# Altium schematic symbol library LATTICEPLDS_Library.SchLib: 291 symbols (part 26 of 32) (continued)
## LFSC80-FC1704/FCN1704 (continued)
part H pins: AA16 VCC12 (io), AA17 VCC (io), AA18 VCC (io), AA19 VCC (io), AA21 VCC (io), AA22 VCC (io), AA24 VCC (io), AA25 VCC (io), AA26 VCC (io), AA27 VCC12 (io), AB16 VCC12 (io), AB17 VCC (io), AB18 VCC (io), AB19 VCC (io), AB21 VCC (io), AB22 VCC (io), AB24 VCC (io), AB25 VCC (io), AB26 VCC (io), AB27 VCC12 (io), AC15 VCCAUX (io), AC16 VCC (io), AC18 VCC (io), AC20 VCC (io), AC23 VCC (io), AC25 VCC (io), AC27 VCC (io), AC28 VCCAUX (io), AD15 VCCAUX (io), AD17 VCC (io), AD19 VCC (io), AD21 VCC (io), AD22 VCC (io), AD24 VCC (io), AD26 VCC (io), AD28 VCCAUX (io), AE15 VCCAUX (io), AE16 VCC (io), AE18 VCC (io), AE20 VCC (io), AE21 VCC (io), AE22 VCC (io), AE23 VCC (io), AE25 VCC (io), AE27 VCC (io), AE28 VCCAUX (io), AF15 VCCAUX (io), AF16 VCC12 (io), AF17 VCC (io), AF19 VCC (io), AF21 VCC (io), AF22 VCC (io), AF24 VCC (io), AF26 VCC (io), AF27 VCC12 (io), AF28 VCCAUX (io), AG15 VCCAUX (io), AG17 VCC12 (io), AG18 VCC (io), AG20 VCC (io), AG21 VCC12 (io), AG22 VCC12 (io), AG23 VCC (io), AG25 VCC (io), AG26 VCC12 (io), AG28 VCCAUX (io), AH14 VCCAUX (io), AH16 VCCAUX (io), AH17 VCCAUX (io), AH18 VCCAUX (io), AH19 VCCAUX (io), AH20 VCCAUX (io), AH23 VCCAUX (io), AH24 VCCAUX (io), AH25 VCCAUX (io), AH26 VCCAUX (io), AH27 VCCAUX (io), AH29 VCCAUX (io), AJ14 VCCAUX (io), AJ15 VCCAUX (io), AJ28 VCCAUX (io), AJ29 VCCAUX (io), AT3 PROBE_VCC (io), P14 VCCAUX (io), P15 VCCAUX (io), P28 VCCAUX (io), P29 VCCAUX (io), R14 VCCAUX (io), R16 VCCAUX (io), R17 VCCAUX (io), R18 VCCAUX (io), R19 VCCAUX (io), R20 VCCAUX (io), R23 VCCAUX (io), R24 VCCAUX (io), R25 VCCAUX (io), R26 VCCAUX (io), R27 VCCAUX (io), R29 VCCAUX (io), T15 VCCAUX (io), T17 VCC12 (io), T18 VCC (io), T20 VCC (io), T21 VCC12 (io), T22 VCC12 (io), T23 VCC (io), T25 VCC (io), T26 VCC12 (io), T28 VCCAUX (io), U15 VCCAUX (io), U16 VCC12 (io), U17 VCC (io), U19 VCC (io), U21 VCC (io), U22 VCC (io), U24 VCC (io), U26 VCC (io), U27 VCC12 (io), U28 VCCAUX (io), V15 VCCAUX (io), V16 VCC (io), V18 VCC (io), V20 VCC (io), V21 VCC (io), V22 VCC (io), V23 VCC (io), V25 VCC (io), V27 VCC (io), V28 VCCAUX (io), W15 VCCAUX (io), W17 VCC (io), W19 VCC (io), W21 VCC (io), W22 VCC (io), W24 VCC (io), W26 VCC (io), W28 VCCAUX (io), Y15 VCCAUX (io), Y16 VCC (io), Y18 VCC (io), Y20 VCC (io), Y23 VCC (io), Y25 VCC (io), Y27 VCC (io), Y28 VCCAUX (io)
part I pins: A2 GND (io), A41 GND (io), AA3 GND (io), AA20 GND (io), AA23 GND (io), AA39 GND (io), AB4 GND (io), AB20 GND (io), AB23 GND (io), AB40 GND (io), AC8 GND (io), AC17 GND (io), AC19 GND (io), AC21 GND (io), AC22 GND (io), AC24 GND (io), AC26 GND (io), AC35 GND (io), AD12 GND (io), AD16 GND (io), AD18 GND (io), AD20 GND (io), AD23 GND (io), AD25 GND (io), AD27 GND (io), AD31 GND (io), AE3 GND (io), AE17 GND (io), AE19 GND (io), AE24 GND (io), AE26 GND (io), AE39 GND (io), AF7 GND (io), AF18 GND (io), AF20 GND (io), AF23 GND (io), AF25 GND (io), AF36 GND (io), AG11 GND (io), AG16 GND (io), AG19 GND (io), AG24 GND (io), AG27 GND (io), AG32 GND (io), AH4 GND (io), AH15 GND (io), AH28 GND (io), AH40 GND (io), AJ8 GND (io), AJ35 GND (io), AK12 GND (io), AK31 GND (io), AL3 GND (io), AL13 GND (io), AL19 GND (io), AL24 GND (io), AL30 GND (io), AL39 GND (io), AM7 GND (io), AM16 GND (io), AM27 GND (io), AM36 GND (io), AP4 GND (io), AP40 GND (io), AR8 GND (io), AR14 GND (io), AR20 GND (io), AR23 GND (io), AR29 GND (io), AR35 GND (io), AT11 GND (io), AT17 GND (io), AT26 GND (io), AT32 GND (io), AU2 PROBE_GND (io), AU3 GND (io), AU39 GND (io), AW6 GND (io), AW12 GND (io), AW18 GND (io), AW22 GND (io), AW28 GND (io), AW34 GND (io), AY9 GND (io), AY15 GND (io), AY21 GND (io), AY25 GND (io), AY31 GND (io), AY37 GND (io), B1 GND (io), B42 GND (io), BA1 GND (io), BA42 GND (io), BB2 GND (io), BB41 GND (io), C3 GND (io), C4 GND (io), C7 GND (io), C8 GND (io), C10 GND (io), C12 GND (io), C13 GND (io), C16 GND (io), C18 GND (io), C19 GND (io), C22 GND (io), C24 GND (io), C27 GND (io), C28 GND (io), C30 GND (io), C33 GND (io), C35 GND (io), C36 GND (io), C39 GND (io), C40 GND (io), D15 GND (io), D21 GND (io), D25 GND (io), D31 GND (io), F4 GND (io), F40 GND (io), G7 GND (io), G11 GND (io), G17 GND (io), G26 GND (io), G32 GND (io), G36 GND (io), H8 GND (io), H14 GND (io), H20 GND (io), H23 GND (io), H29 GND (io), H35 GND (io), J3 GND (io), J39 GND (io), L7 GND (io), L16 GND (io), L27 GND (io), L36 GND (io), M4 GND (io), M19 GND (io), M24 GND (io), M40 GND (io), N12 GND (io), N31 GND (io), P8 GND (io), P35 GND (io), R3 GND (io), R15 GND (io), R28 GND (io), R39 GND (io), T11 GND (io), T16 GND (io), T19 GND (io), T24 GND (io), T27 GND (io), T32 GND (io), U7 GND (io), U18 GND (io), U20 GND (io), U23 GND (io), U25 GND (io), U36 GND (io), V4 GND (io), V17 GND (io), V19 GND (io), V24 GND (io), V26 GND (io), V40 GND (io), W12 GND (io), W16 GND (io), W18 GND (io), W20 GND (io), W23 GND (io), W25 GND (io), W27 GND (io), W31 GND (io), Y8 GND (io), Y17 GND (io), Y19 GND (io), Y21 GND (io), Y22 GND (io), Y24 GND (io), Y26 GND (io), Y35 GND (io)
part J pins: A3 PCS 3E0 CH 0 OUT P / A_HDOUTP0_R (io), A4 PCS 3E0 CH 1 OUT N / A_HDOUTN1_R (io), A5 PCS 3E0 CH 2 OUT P / A_HDOUTP2_R (io), A6 PCS 3E0 CH 3 OUT P / A_HDOUTP3_R (io), A7 PCS 3E1 CH 0 OUT N / B_HDOUTN0_R (io), A8 PCS 3E1 CH 1 OUT N / B_HDOUTN1_R (io), A9 PCS 3E1 CH 2 OUT N / B_HDOUTN2_R (io), A10 PCS 3E1 CH 3 OUT N / B_HDOUTN3_R (io), A11 PCS 3E2 CH 0 OUT N / C_HDOUTN0_R (io), A12 PCS 3E2 CH 1 OUT N / C_HDOUTN1_R (io), A13 PCS 3E2 CH 2 OUT N / C_HDOUTN2_R (io), A14 PCS 3E2 CH 3 OUT N / C_HDOUTN3_R (io), A15 PCS 3E3 CH 0 OUT N / D_HDOUTN0_R (io), A16 PCS 3E3 CH 1 OUT N / D_HDOUTN1_R (io), A17 PCS 3E3 CH 2 OUT N / D_HDOUTN2_R (io), A18 PCS 3E3 CH 3 OUT N / D_HDOUTN3_R (io), A25 PCS 363 CH 3 OUT N / D_HDOUTN3_L (io), A26 PCS 363 CH 2 OUT N / D_HDOUTN2_L (io), A27 PCS 363 CH 1 OUT N / D_HDOUTN1_L (io), A28 PCS 363 CH 0 OUT N / D_HDOUTN0_L (io), A29 PCS 362 CH 3 OUT N / C_HDOUTN3_L (io), A30 PCS 362 CH 2 OUT N / C_HDOUTN2_L (io), A31 PCS 362 CH 1 OUT N / C_HDOUTN1_L (io), A32 PCS 362 CH 0 OUT N / C_HDOUTN0_L (io), A33 PCS 361 CH 3 OUT N / B_HDOUTN3_L (io), A34 PCS 361 CH 2 OUT N / B_HDOUTN2_L (io), A35 PCS 361 CH 1 OUT N / B_HDOUTN1_L (io), A36 PCS 361 CH 0 OUT N / B_HDOUTN0_L (io), A37 PCS 360 CH 3 OUT P / A_HDOUTP3_L (io), A38 PCS 360 CH 2 OUT P / A_HDOUTP2_L (io), A39 PCS 360 CH 1 OUT N / A_HDOUTN1_L (io), A40 PCS 360 CH 0 OUT P / A_HDOUTP0_L (io), AT40 XRES (io), B2 VCC12 (io), B3 PCS 3E0 CH 0 OUT N / A_HDOUTN0_R (io), B4 PCS 3E0 CH 1 OUT P / A_HDOUTP1_R (io), B5 PCS 3E0 CH 2 OUT N / A_HDOUTN2_R (io), B6 PCS 3E0 CH 3 OUT N / A_HDOUTN3_R (io), B7 PCS 3E1 CH 0 OUT P / B_HDOUTP0_R (io), B8 PCS 3E1 CH 1 OUT P / B_HDOUTP1_R (io), B9 PCS 3E1 CH 2 OUT P / B_HDOUTP2_R (io), B10 PCS 3E1 CH 3 OUT P / B_HDOUTP3_R (io), B11 PCS 3E2 CH 0 OUT P / C_HDOUTP0_R (io), B12 PCS 3E2 CH 1 OUT P / C_HDOUTP1_R (io), B13 PCS 3E2 CH 2 OUT P / C_HDOUTP2_R (io), B14 PCS 3E2 CH 3 OUT P / C_HDOUTP3_R (io), B15 PCS 3E3 CH 0 OUT P / D_HDOUTP0_R (io), B16 PCS 3E3 CH 1 OUT P / D_HDOUTP1_R (io), B17 PCS 3E3 CH 2 OUT P / D_HDOUTP2_R (io), B18 PCS 3E3 CH 3 OUT P / D_HDOUTP3_R (io), B25 PCS 363 CH 3 OUT P / D_HDOUTP3_L (io), B26 PCS 363 CH 2 OUT P / D_HDOUTP2_L (io), B27 PCS 363 CH 1 OUT P / D_HDOUTP1_L (io), B28 PCS 363 CH 0 OUT P / D_HDOUTP0_L (io), B29 PCS 362 CH 3 OUT P / C_HDOUTP3_L (io), B30 PCS 362 CH 2 OUT P / C_HDOUTP2_L (io), B31 PCS 362 CH 1 OUT P / C_HDOUTP1_L (io), B32 PCS 362 CH 0 OUT P / C_HDOUTP0_L (io), B33 PCS 361 CH 3 OUT P / B_HDOUTP3_L (io), B34 PCS 361 CH 2 OUT P / B_HDOUTP2_L (io), B35 PCS 361 CH 1 OUT P / B_HDOUTP1_L (io), B36 PCS 361 CH 0 OUT P / B_HDOUTP0_L (io), B37 PCS 360 CH 3 OUT N / A_HDOUTN3_L (io), B38 PCS 360 CH 2 OUT N / A_HDOUTN2_L (io), B39 PCS 360 CH 1 OUT P / A_HDOUTP1_L (io), B40 PCS 360 CH 0 OUT N / A_HDOUTN0_L (io), B41 VCC12 (io), C1 PCS 3E0 CH 0 IN P / A_HDINP0_R (io), C2 A_VDDOB1_R (io), C5 B_VDDOB3_R (io), C6 C_VDDIB1_R (io), C9 D_VDDOB2_R (io), C11 VCC12 (io), C14 VCC12 (io), C15 D_VDDIB2_R (io), C17 VCC12 (io), C29 D_VDDIB3_L (io), C31 VCC12 (io), C32 VCC12 (io), C34 D_VDDOB2_L (io), C37 C_VDDIB1_L (io), C38 B_VDDOB3_L (io), C41 A_VDDOB1_L (io), C42 PCS 360 CH 0 IN P / A_HDINP0_L (io), D1 PCS 3E0 CH 0 IN N / A_HDINN0_R (io), D2 A_VDDOB2_R (io), D3 PCS 3E0 CH 1 IN P / A_HDINP1_R (io), D4 PCS 3E0 CH 2 IN P / A_HDINP2_R (io), D5 PCS 3E0 CH 3 IN P / A_HDINP3_R (io), D6 PCS 3E1 CH 0 IN P / B_HDINP0_R (io), D7 PCS 3E1 CH 1 IN P / B_HDINP1_R (io), D8 PCS 3E1 CH 2 IN P / B_HDINP2_R (io), D9 PCS 3E1 CH 3 IN P / B_HDINP3_R (io), D10 PCS 3E2 CH 0 IN P / C_HDINP0_R (io), D11 PCS 3E2 CH 1 IN P / C_HDINP1_R (io), D12 PCS 3E2 CH 2 IN P / C_HDINP2_R (io), D13 PCS 3E2 CH 3 IN P / C_HDINP3_R (io), D14 PCS 3E3 CH 0 IN P / D_HDINP0_R (io), D16 PCS 3E3 CH 2 IN P / D_HDINP2_R (io), D17 D_VDDOB3_R (io), D24 VCC12 (io), D26 PCS 363 CH 3 IN P / D_HDINP3_L (io), D27 PCS 363 CH 2 IN P / D_HDINP2_L (io), D28 PCS 363 CH 1 IN P / D_HDINP1_L (io), D29 PCS 363 CH 0 IN P / D_HDINP0_L (io), D30 PCS 362 CH 3 IN P / C_HDINP3_L (io), D32 PCS 362 CH 1 IN P / C_HDINP1_L (io), D33 PCS 362 CH 0 IN P / C_HDINP0_L (io), D34 PCS 361 CH 3 IN P / B_HDINP3_L (io), D35 PCS 361 CH 2 IN P / B_HDINP2_L (io), D36 PCS 361 CH 1 IN P / B_HDINP1_L (io), D37 PCS 361 CH 0 IN P / B_HDINP0_L (io), D38 PCS 360 CH 3 IN P / A_HDINP3_L (io), D39 PCS 360 CH 2 IN P / A_HDINP2_L (io), D40 PCS 360 CH 1 IN P / A_HDINP1_L (io), D41 A_VDDOB2_L (io), D42 PCS 360 CH 0 IN N / A_HDINN0_L (io), E1 A_VDDOB0_R (io), E2 A_VDDIB1_R (io), E3 PCS 3E0 CH 1 IN N / A_HDINN1_R (io), E4 PCS 3E0 CH 2 IN N / A_HDINN2_R (io), E5 PCS 3E0 CH 3 IN N / A_HDINN3_R (io), E6 PCS 3E1 CH 0 IN N / B_HDINN0_R (io), E7 PCS 3E1 CH 1 IN N / B_HDINN1_R (io), E8 PCS 3E1 CH 2 IN N / B_HDINN2_R (io), E9 PCS 3E1 CH 3 IN N / B_HDINN3_R (io), E10 PCS 3E2 CH 0 IN N / C_HDINN0_R (io), E11 PCS 3E2 CH 1 IN N / C_HDINN1_R (io), E12 PCS 3E2 CH 2 IN N / C_HDINN2_R (io), E13 PCS 3E2 CH 3 IN N / C_HDINN3_R (io), E14 PCS 3E3 CH 0 IN N / D_HDINN0_R (io), E15 PCS 3E3 CH 1 IN P / D_HDINP1_R (io), E16 PCS 3E3 CH 2 IN N / D_HDINN2_R (io), E17 PCS 3E3 CH 3 IN P / D_HDINP3_R (io), E25 D_VDDOB3_L (io), E26 PCS 363 CH 3 IN N / D_HDINN3_L (io), E27 PCS 363 CH 2 IN N / D_HDINN2_L (io), E28 PCS 363 CH 1 IN N / D_HDINN1_L (io), E29 PCS 363 CH 0 IN N / D_HDINN0_L (io), E30 PCS 362 CH 3 IN N / C_HDINN3_L (io), E31 PCS 362 CH 2 IN P / C_HDINP2_L (io), E32 PCS 362 CH 1 IN N / C_HDINN1_L (io), E33 PCS 362 CH 0 IN N / C_HDINN0_L (io), E34 PCS 361 CH 3 IN N / B_HDINN3_L (io), E35 PCS 361 CH 2 IN N / B_HDINN2_L (io), E36 PCS 361 CH 1 IN N / B_HDINN1_L (io), E37 PCS 361 CH 0 IN N / B_HDINN0_L (io), E38 PCS 360 CH 3 IN N / A_HDINN3_L (io), E39 PCS 360 CH 2 IN N / A_HDINN2_L (io), E40 PCS 360 CH 1 IN N / A_HDINN1_L (io), E41 A_VDDIB1_L (io), E42 A_VDDOB0_L (io), F1 VCC12 (io), F2 VCC12 (io), F5 VCC12 (io), F6 VCC12 (io), F7 VCC12 (io), F8 D_VDDOB1_R (io), F9 B_VDDIB0_R (io), F10 VCC12 (io), F11 VCC12 (io), F12 VCC12 (io), F13 D_VDDIB1_R (io), F14 VCC12 (io), F15 PCS 3E3 CH 1 IN N / D_HDINN1_R (io), F16 D_VDDIB3_R (io), F17 PCS 3E3 CH 3 IN N / D_HDINN3_R (io), F28 VCC12 (io), F29 VCC12 (io), F30 VCC12 (io), F31 PCS 362 CH 2 IN N / C_HDINN2_L (io), F32 VCC12 (io), F33 VCC12 (io), F34 B_VDDIB0_L (io), F35 D_VDDOB1_L (io), F36 VCC12 (io), F37 VCC12 (io), F38 VCC12 (io), F41 VCC12 (io), F42 VCC12 (io), G4 B_VDDOB0_R (io), G5 VCC12 (io), G6 VCC12 (io), G9 A_REFCLKP_R (io), G12 C_VDDIB0_R (io), G13 C_VDDIB2_R (io), G14 C_VDDIB3_R (io), G15 VCC12 (io), G16 VCC12 (io), G25 D_VDDIB2_L (io), G27 VCC12 (io), G28 VCC12 (io), G29 C_VDDIB3_L (io), G30 C_VDDIB2_L (io), G31 C_VDDIB0_L (io), G34 A_REFCLKP_L (io), G37 VCC12 (io), G38 VCC12 (io), G39 B_VDDOB0_L (io), H4 A_VDDIB0_R (io), H5 VCC12 (io), H6 VCC12 (io), H9 A_REFCLKN_R (io), H10 RESP_URC (io), H11 B_VDDIB2_R (io), H12 B_VDDIB3_R (io), H13 VCC12 (io), H15 VCC12 (io), H16 D_VDDIB0_R (io), H26 D_VDDIB1_L (io), H27 D_VDDIB0_L (io), H28 VCC12 (io), H30 VCC12 (io), H31 B_VDDIB3_L (io), H32 B_VDDIB2_L (io), H33 RESP_ULC (io), H34 A_REFCLKN_L (io), H37 VCC12 (io), H38 VCC12 (io), H39 A_VDDIB0_L (io), J8 VCC12 (io), J9 VCC12 (io), J10 C_VDDOB3_R (io), J11 VCC12 (io), J12 VCC12 (io), J13 VCC12 (io), J14 VCC12 (io), J15 C_REFCLKP_R (io), J28 C_REFCLKP_L (io), J29 VCC12 (io), J30 VCC12 (io), J31 VCC12 (io), J32 VCC12 (io), J33 C_VDDOB3_L (io), J34 VCC12 (io), J35 VCC12 (io), K8 B_VDDOB1_R (io), K9 VCC12 (io), K10 C_VDDOB2_R (io), K11 VCC12 (io), K12 VCC12 (io), K13 B_VDDIB1_R (io), K14 VCC12 (io), K15 C_REFCLKN_R (io), K17 VCC12 (io), K28 C_REFCLKN_L (io), K29 VCC12 (io), K30 B_VDDIB1_L (io), K31 VCC12 (io), K32 VCC12 (io), K33 C_VDDOB2_L (io), K34 VCC12 (io), K35 B_VDDOB1_L (io), L9 VCC12 (io), L10 A_VDDOB3_R (io), L11 C_VDDOB1_R (io), L12 B_VDDOB2_R (io), L13 A_VDDIB3_R (io), L14 B_REFCLKP_R (io), L17 D_REFCLKP_R (io), L26 D_REFCLKP_L (io), L29 B_REFCLKP_L (io), L30 A_VDDIB3_L (io), L31 B_VDDOB2_L (io), L32 C_VDDOB1_L (io), L33 A_VDDOB3_L (io), L34 VCC12 (io), M10 VCC12 (io), M11 A_VDDIB2_R (io), M12 C_VDDOB0_R (io), M13 D_VDDOB0_R (io), M14 B_REFCLKN_R (io), M17 D_REFCLKN_R (io), M26 D_REFCLKN_L (io), M29 B_REFCLKN_L (io), M30 D_VDDOB0_L (io), M31 C_VDDOB0_L (io), M32 A_VDDIB2_L (io), M33 VCC12 (io), N13 VCC12 (io), N14 VCC12 (io), N29 VCC12 (io), N30 VCC12 (io), P12 TDI (io), P16 VDDAX25_R (io), P18 VCCJ (io), P19 TDO/RDDATA / TDO (io), P20 TCK (io), P27 VDDAX25_L (io), R21 TMS (io)
part K pins: AG5 NC (io), AG38 NC (io), AH5 NC (io), AH38 NC (io), AJ4 NC (io), AJ39 NC (io), AK4 NC (io), AK39 NC (io), AL2 NC (io), AL41 NC (io), AM2 NC (io), AM3 NC (io), AM4 NC (io), AM39 NC (io), AM40 NC (io), AM41 NC (io), AN3 NC (io), AN4 NC (io), AN39 NC (io), AN40 NC (io), AR1 NC (io), AR42 NC (io), AT1 NC (io), AT42 NC (io), G10 NC (io), G33 NC (io), J16 NC (io), J27 NC (io), K3 NC (io), K4 NC (io), K16 NC (io), K27 NC (io), K39 NC (io), K40 NC (io), L3 NC (io), L4 NC (io), L15 NC (io), L18 NC (io), L25 NC (io), L28 NC (io), L39 NC (io), L40 NC (io), M5 NC (io), M15 NC (io), M18 NC (io), M25 NC (io), M28 NC (io), M38 NC (io), N6 NC (io), N37 NC (io), P6 NC (io), P37 NC (io)
part A text: BANK 7; (1 OF 11)
part B text: (2 OF 11); BANK 6
part C text: BANK 5; (3 OF 11)
part D text: (4 OF 11); BANK 4
part E text: BANK 3; (5 OF 11)
part F text: (6 OF 11); BANK 2
part G text: BANK 1; (7 OF 11)
part H text: (8 OF 11)
part I text: (9 OF 11)
part J text: (10 OF 11); SERDES
part K text: (11 OF 11)

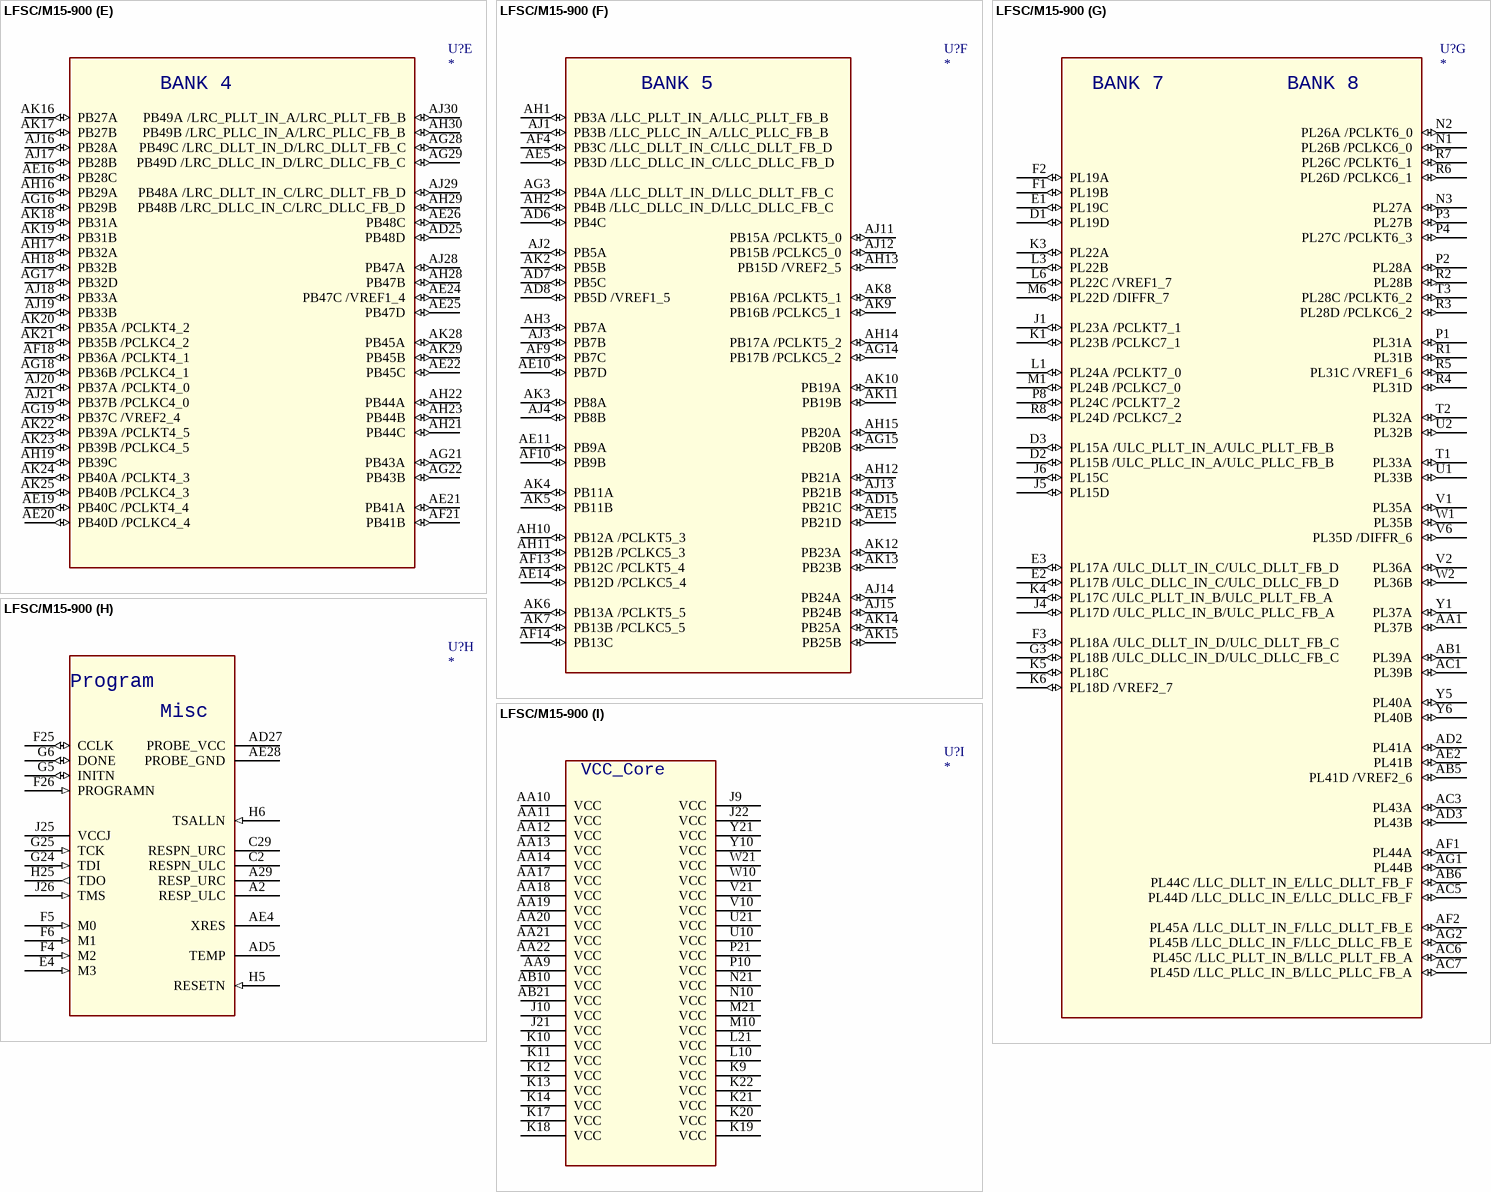
[diagram p243: symbol LFSC/M15-900]

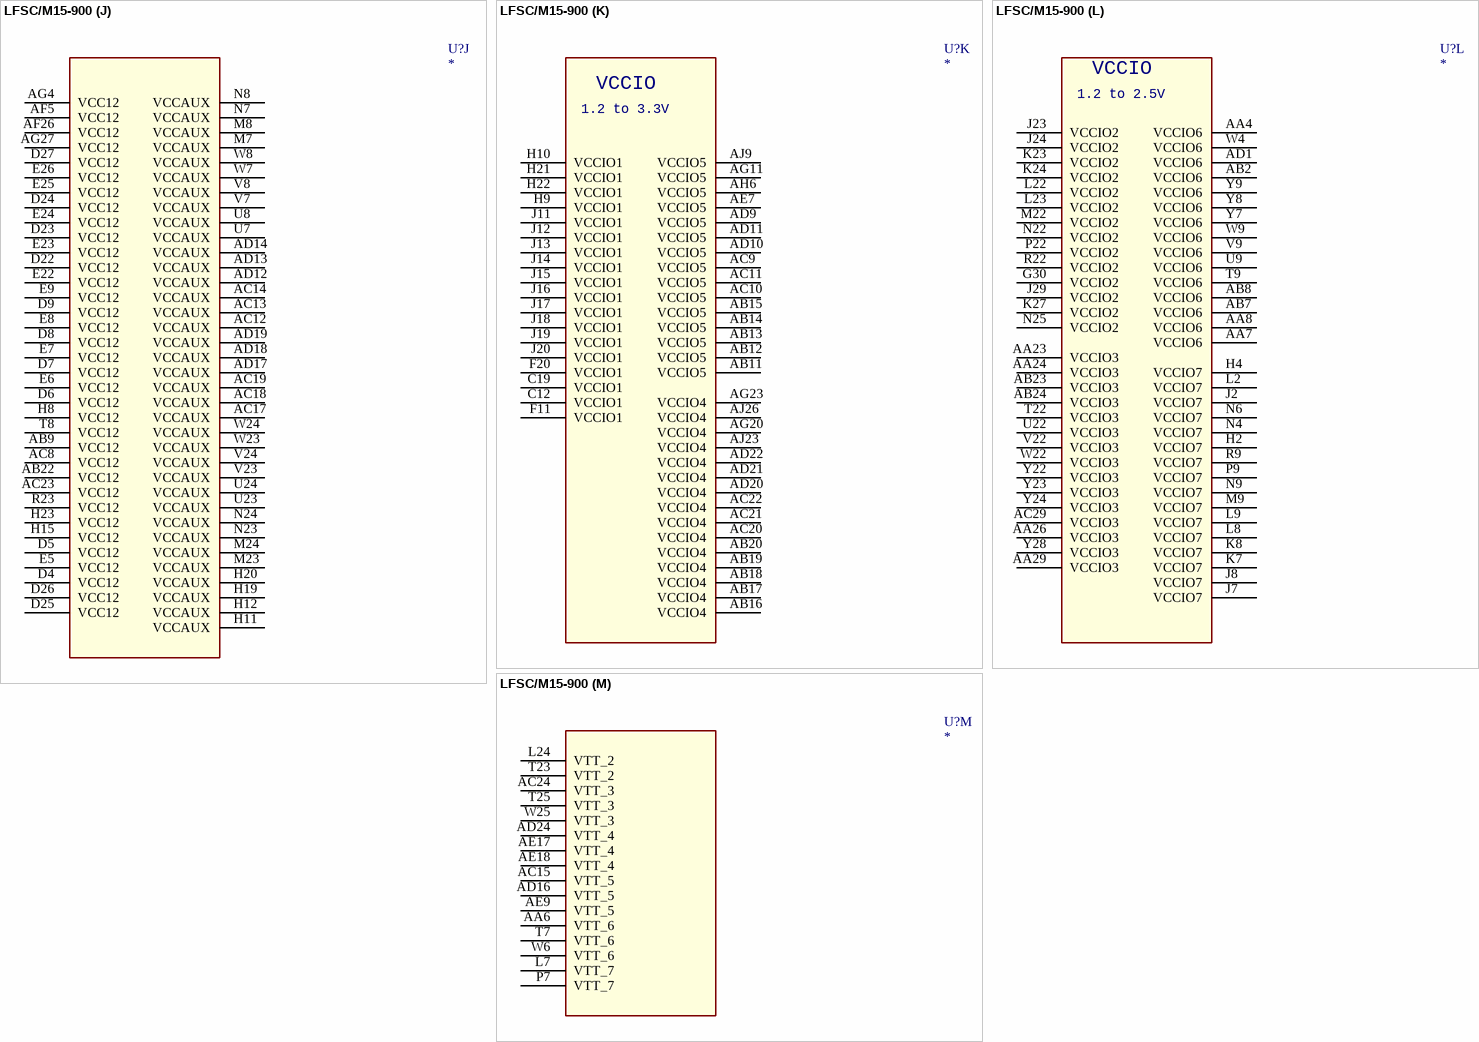
[diagram p244: symbol LFSC/M15-900]

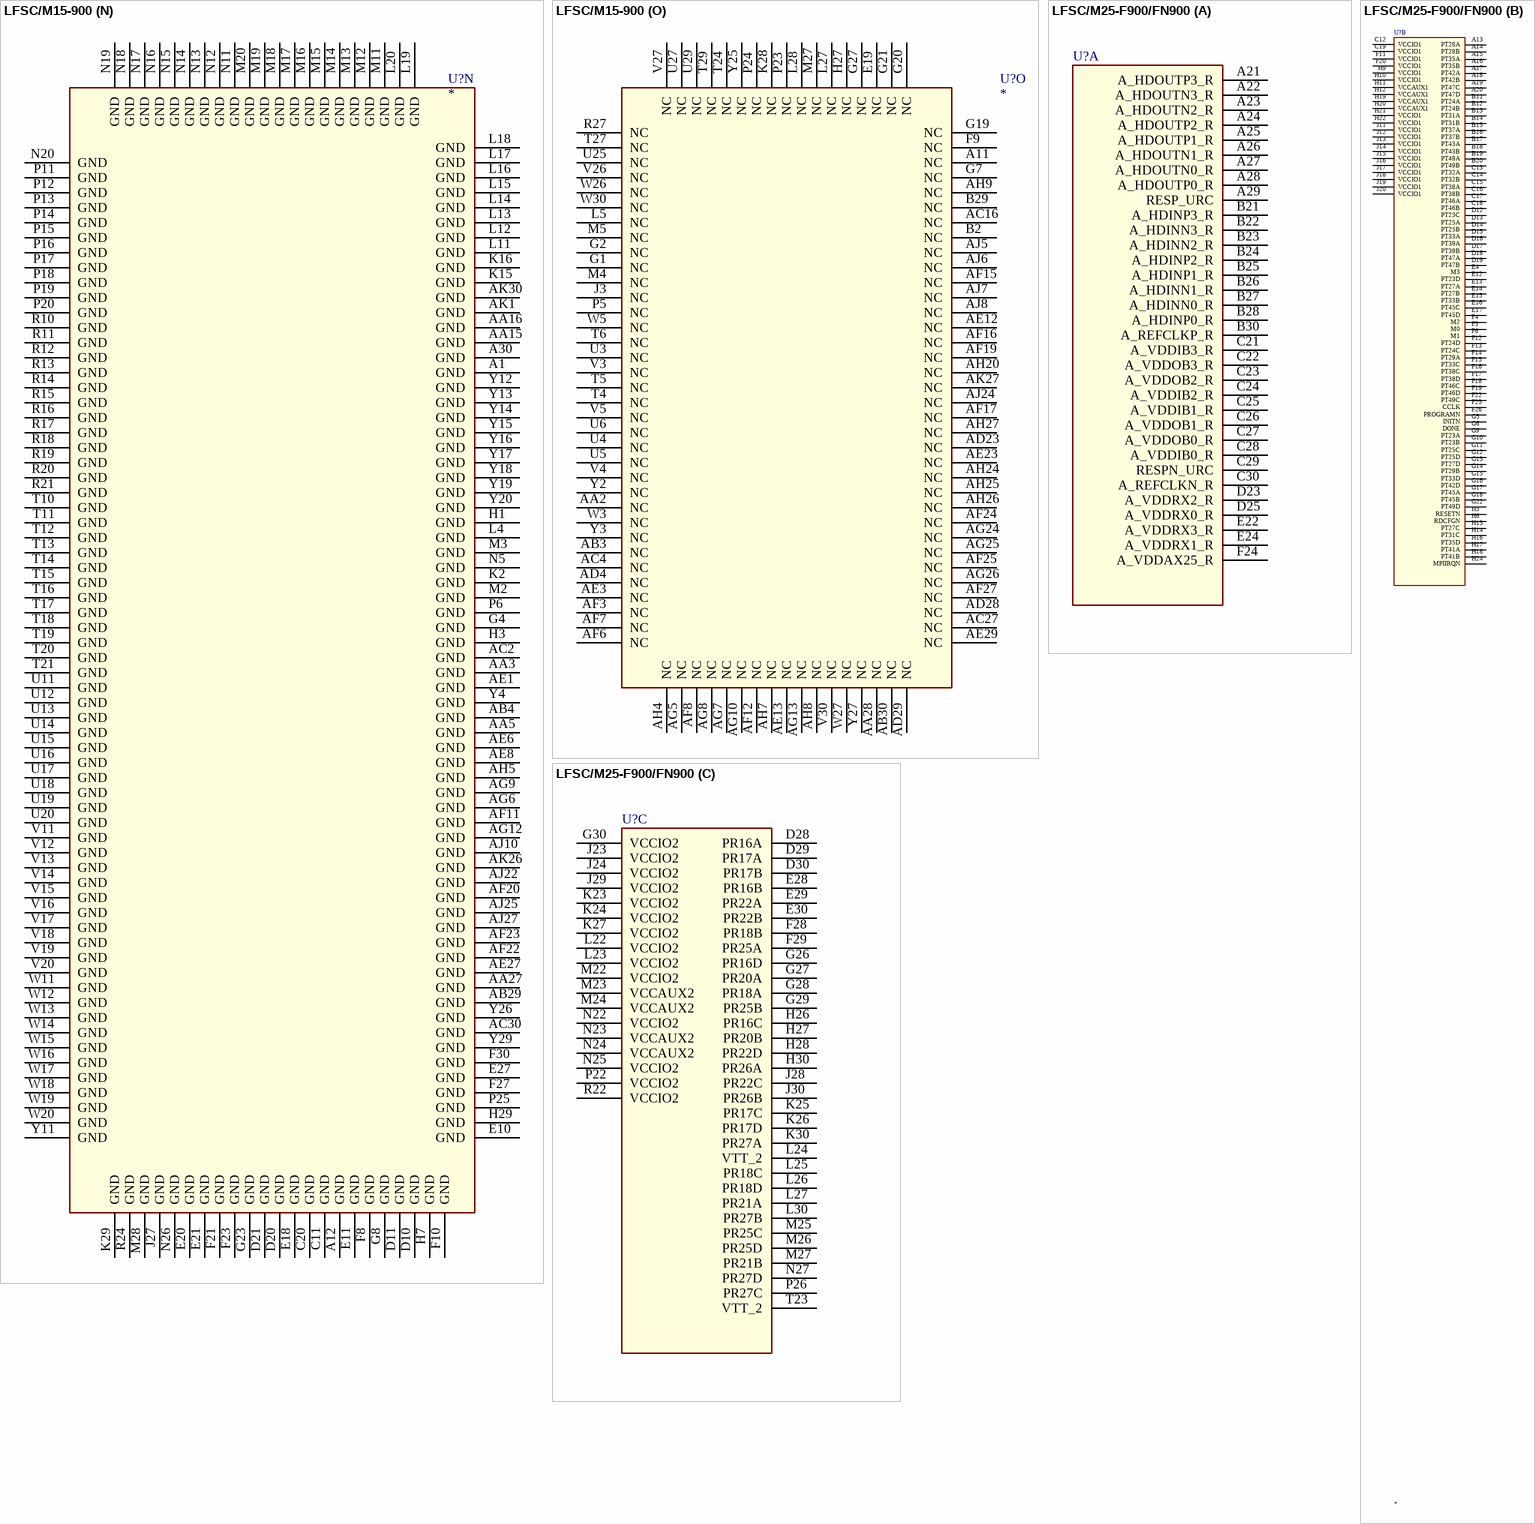
[diagram p245: symbols LFSC/M15-900 to LFSC/M25-F900/FN900]